# Altium footprint library PcbLib1.PcbLib: 37 footprints (part 3 of 3)
Each footprint in its own frame and in the unit in brackets; x right, y up, seen from the top. Pads: shape width x height; smd on the part's side, far side on the other; paste and mask are expansions set on the pad; w line width, h text height; cw(c..) or ccw(c..) is an arc to the next point about the centre after c.
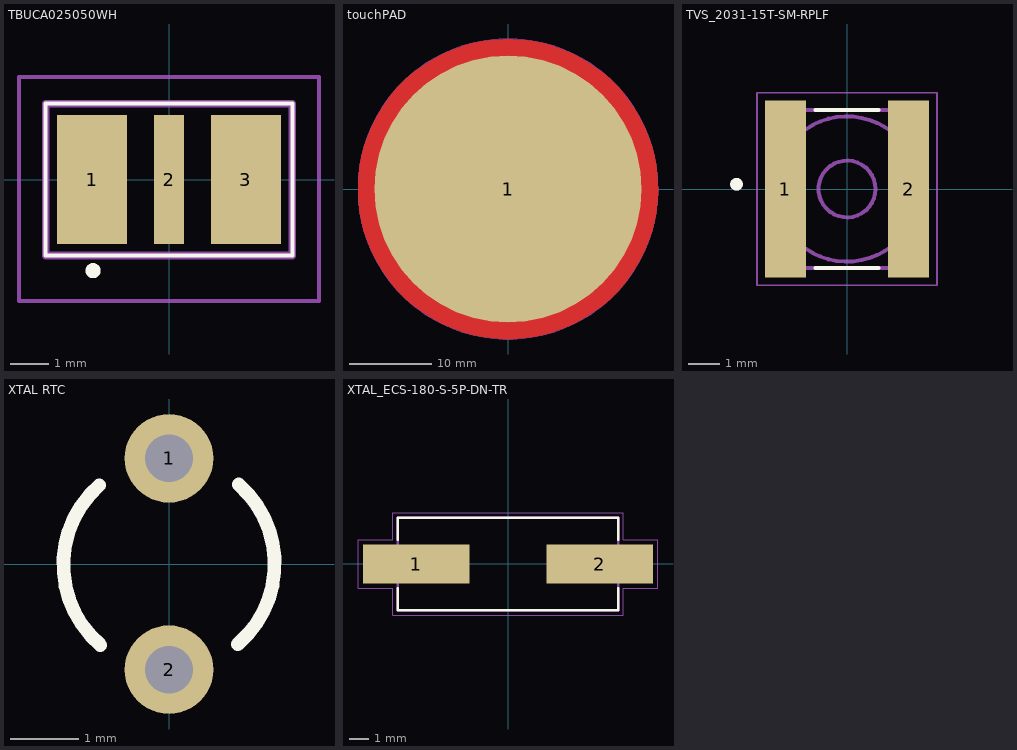
[diagram p2: the footprints below, top view; thin cyan lines are the x and y axes]

## TBUCA025050WH [mm]
pads (3):
  rect 1.85x3.4 smd: 1(-2.025,0) 3(2.025,0)
  rect 0.8x3.4 smd: 2(0,0)
Top Overlay:
  lines w0.1: -3.25,-2 -3.25,2 3.25,2 3.25,-2 -3.25,-2
  lines w0.2: -2,-2.5 cw(c-2,-2.4) -2,-2.3 cw(c-2,-2.4) -2,-2.5
Mechanical 13:
  lines w0.2: -3.25,-2 -3.25,2 3.25,2 3.25,-2 -3.25,-2
Mechanical 15:
  lines w0.1: -3.95,-3.2 -3.95,2.7 3.95,2.7 3.95,-3.2 -3.95,-3.2
3D body "TBU-CA065-200-WH.stp": height 0.88, standoff 0, extent -3.25,-2 3.25,2

## touchPAD [mm]
pads (1):
  round 32.5 smd mask+0.102: 1(0,0)
Top Layer:
  pour cut-out: 0,-18.25 -0.597,-18.25 -1.79,-18.172 -2.974,-18.016 -4.146,-17.783 -5.301,-17.474 -6.432,-17.089 -7.536,-16.632 -8.608,-16.104 -9.642,-15.506 -10.636,-14.842 -11.584,-14.115 -12.482,-13.327 -13.327,-12.482 -14.115,-11.584 -14.842,-10.636 -15.506,-9.642 -16.104,-8.608 -16.632,-7.536 -17.089,-6.432 -17.474,-5.301 -17.783,-4.146 -18.016,-2.974 -18.172,-1.79 -18.25,-0.597 -18.25,0 -18.25,0.597 -18.172,1.79 -18.016,2.974 -17.783,4.146 -17.474,5.301 -17.089,6.432 -16.632,7.536 -16.104,8.608 -15.506,9.642 -14.842,10.636 -14.115,11.584 -13.327,12.482 -12.482,13.327 -11.584,14.115 -10.636,14.842 -9.642,15.506 -8.608,16.104 -7.536,16.632 -6.432,17.089 -5.301,17.474 -4.146,17.783 -2.974,18.016 -1.79,18.172 -0.597,18.25 0,18.25 0.597,18.25 1.79,18.172 2.974,18.016 4.146,17.783 5.301,17.474 6.432,17.089 7.536,16.632 8.608,16.104 9.642,15.506 10.636,14.842 11.584,14.115 12.482,13.327 13.327,12.482 14.115,11.584 14.842,10.636 15.506,9.642 16.104,8.608 16.632,7.536 17.089,6.432 17.474,5.301 17.783,4.146 18.016,2.974 18.172,1.79 18.25,0.597 18.25,0 18.25,-0.597 18.172,-1.79 18.016,-2.974 17.783,-4.146 17.474,-5.301 17.089,-6.432 16.632,-7.536 16.104,-8.608 15.506,-9.642 14.842,-10.636 14.115,-11.584 13.327,-12.482 12.482,-13.327 11.584,-14.115 10.636,-14.842 9.642,-15.506 8.608,-16.104 7.536,-16.632 6.432,-17.089 5.301,-17.474 4.146,-17.783 2.974,-18.016 1.79,-18.172 0.597,-18.25
Bottom Layer:
  pour cut-out: 0,-18.25 -0.597,-18.25 -1.79,-18.172 -2.974,-18.016 -4.146,-17.783 -5.301,-17.474 -6.432,-17.089 -7.536,-16.632 -8.608,-16.104 -9.642,-15.506 -10.636,-14.842 -11.584,-14.115 -12.482,-13.327 -13.327,-12.482 -14.115,-11.584 -14.842,-10.636 -15.506,-9.642 -16.104,-8.608 -16.632,-7.536 -17.089,-6.432 -17.474,-5.301 -17.783,-4.146 -18.016,-2.974 -18.172,-1.79 -18.25,-0.597 -18.25,0 -18.25,0.597 -18.172,1.79 -18.016,2.974 -17.783,4.146 -17.474,5.301 -17.089,6.432 -16.632,7.536 -16.104,8.608 -15.506,9.642 -14.842,10.636 -14.115,11.584 -13.327,12.482 -12.482,13.327 -11.584,14.115 -10.636,14.842 -9.642,15.506 -8.608,16.104 -7.536,16.632 -6.432,17.089 -5.301,17.474 -4.146,17.783 -2.974,18.016 -1.79,18.172 -0.597,18.25 0,18.25 0.597,18.25 1.79,18.172 2.974,18.016 4.146,17.783 5.301,17.474 6.432,17.089 7.536,16.632 8.608,16.104 9.642,15.506 10.636,14.842 11.584,14.115 12.482,13.327 13.327,12.482 14.115,11.584 14.842,10.636 15.506,9.642 16.104,8.608 16.632,7.536 17.089,6.432 17.474,5.301 17.783,4.146 18.016,2.974 18.172,1.79 18.25,0.597 18.25,0 18.25,-0.597 18.172,-1.79 18.016,-2.974 17.783,-4.146 17.474,-5.301 17.089,-6.432 16.632,-7.536 16.104,-8.608 15.506,-9.642 14.842,-10.636 14.115,-11.584 13.327,-12.482 12.482,-13.327 11.584,-14.115 10.636,-14.842 9.642,-15.506 8.608,-16.104 7.536,-16.632 6.432,-17.089 5.301,-17.474 4.146,-17.783 2.974,-18.016 1.79,-18.172 0.597,-18.25
Top Courtyard:
  circle w0.1: c0,0 r18.25
  circle w0.1: c0,0 r16.25

## TVS_2031-15T-SM-RPLF [mm]
pads (2):
  rect 1.3x5.6 smd: 1(-1.95,0) 2(1.95,0)
Top Overlay:
  circle w0.2: c-3.5,0.15 r0.1
  lines w0.127: -1,-2.5 1,-2.5 ; -1,2.5 1,2.5
Mechanical 13:
  circle w0.2: c-3.5,0.15 r0.1
  circle w0.127: c0,0 r0.9
  circle w0.127: c0,0 r2.3
  lines w0.127: -2.5,-2 -2.5,2 -2,2.5 2,2.5 2.5,2 2.5,-2 2,-2.5 -2,-2.5 -2.5,-2
Mechanical 15:
  lines w0.05: -2.85,-3.05 -2.85,3.05 2.85,3.05 2.85,-3.05 -2.85,-3.05

## XTAL RTC [mm]
pads (2):
  round 1.3 hole 0.7: 1(0,1.55) 2(0,-1.55)
Top Overlay:
  lines w0.2: -1.022,1.155 ccw(c0,-0.01) -1.006,-1.189 ; 1.006,-1.179 ccw(c0,0) 1.022,1.165
3D body "Crystal TH.STEP": height 8.98, standoff -1.8, extent -1.6,-1.725 1.6,1.725

## XTAL_ECS-180-S-5P-DN-TR [mm]
pads (2):
  rect 5.5x2 smd: 1(-4.75,0) 2(4.75,0)
Top Overlay:
  lines w0.127: -5.7,-1.254 -5.7,-2.4 5.7,-2.4 5.7,-1.254 ; -5.7,1.254 -5.7,2.4 5.7,2.4 5.7,1.254
Mechanical 13:
  lines w0.127: -5.7,-2.4 -5.7,2.4 5.7,2.4 5.7,-2.4 -5.7,-2.4
Mechanical 15:
  lines w0.05: -7.75,-1.25 -5.95,-1.25 -5.95,-2.65 5.95,-2.65 5.95,-1.25 7.75,-1.25 7.75,1.25 5.95,1.25 5.95,2.65 -5.95,2.65 -5.95,1.25 -7.75,1.25 -7.75,-1.25
3D body "ECS-180-S-5P-DN-TR.STEP": height 4.3, standoff 0, extent -6.6,-2.39 6.6,2.41